# Altium footprint library 2.03-TSSOP&ETSSOP封装.PcbLib: 40 footprints (part 3 of 3)
Each footprint in its own frame and in the unit in brackets; x right, y up, seen from the top. Pads: shape width x height; smd on the part's side, far side on the other; paste and mask are expansions set on the pad; w line width, h text height; cw(c..) or ccw(c..) is an arc to the next point about the centre after c.
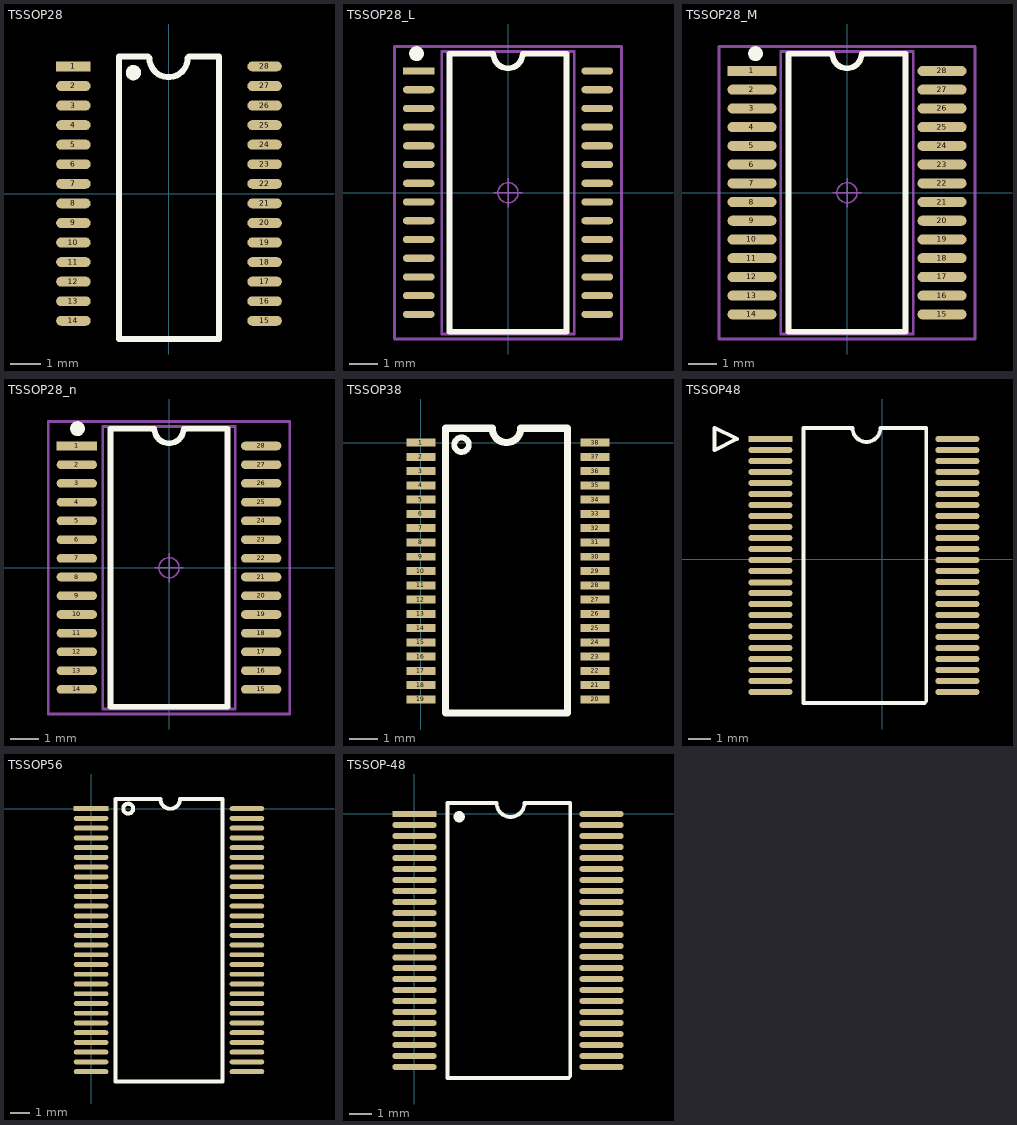
[diagram p2: the footprints below, top view; thin cyan lines are the x and y axes]

## TSSOP28 [mm] "9.70x4.40x1.00 e=0.65  封装库来自淘宝卖家 ID：黄晶宝石"
pads (28):
  rect 1.143x0.33 smd: 1(-3.175,4.225)
  oval 1.143x0.33 smd: 2(-3.175,3.575) 3(-3.175,2.925) 4(-3.175,2.275) 5(-3.175,1.625) 6(-3.175,0.975) 7(-3.175,0.325) 8(-3.175,-0.325) 9(-3.175,-0.975) 10(-3.175,-1.625) 11(-3.175,-2.275) 12(-3.175,-2.925) 13(-3.175,-3.575) 14(-3.175,-4.225) 15(3.175,-4.225) 16(3.175,-3.575) 17(3.175,-2.925) 18(3.175,-2.275) 19(3.175,-1.625) 20(3.175,-0.975) 21(3.175,-0.325) 22(3.175,0.325) 23(3.175,0.975) 24(3.175,1.625) 25(3.175,2.275) 26(3.175,2.925) 27(3.175,3.575) 28(3.175,4.225)
Top Overlay:
  circle w0.254: c-1.182,4.017 r0.127
  lines w0.2: -0.7,4.55 -1.665,4.55 -1.665,-4.829 1.665,-4.829 1.665,4.55 0.672,4.55 ; -0.649,4.499 ccw(c-0.014,4.499) 0.621,4.499
3D body "TSSOP28.STEP": height 1.03, standoff -0.02, extent -3.202,-4.9 3.202,4.9

## TSSOP28_L [mm] "9.8*6.4*1mm（长宽高）"
pads (28):
  rect 1.1x0.25 smd: 1(-3.1,4.225)
  oval 1.1x0.25 smd: 2(-3.1,3.575) 3(-3.1,2.925) 4(-3.1,2.275) 5(-3.1,1.625) 6(-3.1,0.975) 7(-3.1,0.325) 8(-3.1,-0.325) 9(-3.1,-0.975) 10(-3.1,-1.625) 11(-3.1,-2.275) 12(-3.1,-2.925) 13(-3.1,-3.575) 14(-3.1,-4.225) 15(3.1,-4.225) 16(3.1,-3.575) 17(3.1,-2.925) 18(3.1,-2.275) 19(3.1,-1.625) 20(3.1,-0.975) 21(3.1,-0.325) 22(3.1,0.325) 23(3.1,0.975) 24(3.1,1.625) 25(3.1,2.275) 26(3.1,2.925) 27(3.1,3.575) 28(3.1,4.225)
Top Overlay:
  circle w0.254: c-3.175,4.826 r0.13
  lines w0.2: -2.032,-4.826 2.032,-4.826 2.032,4.826 0.508,4.826 cw(c0,4.826) -0.508,4.826 -2.032,4.826 -2.032,-4.826
Mechanical 13:
  lines w0.1: -2.3,-4.9 -2.3,4.9 2.3,4.9 2.3,-4.9 -2.3,-4.9
Mechanical 15:
  circle w0.05: c0,0 r0.35
  lines w0.05: -0.5,0 0.5,0 ; 0,-0.5 0,0.5
  lines w0.1: -3.937,-5.08 -3.937,5.08 3.937,5.08 3.937,-5.08 -3.937,-5.08
3D body "TSSOP28.STEP": height 1.03, standoff -0.02, extent -3.202,-4.9 3.202,4.9

## TSSOP28_M [mm] "9.8*6.4*1mm（长宽高）"
pads (28):
  rect 1.7x0.35 smd: 1(-3.3,4.225)
  oval 1.7x0.35 smd: 2(-3.3,3.575) 3(-3.3,2.925) 4(-3.3,2.275) 5(-3.3,1.625) 6(-3.3,0.975) 7(-3.3,0.325) 8(-3.3,-0.325) 9(-3.3,-0.975) 10(-3.3,-1.625) 11(-3.3,-2.275) 12(-3.3,-2.925) 13(-3.3,-3.575) 14(-3.3,-4.225) 15(3.3,-4.225) 16(3.3,-3.575) 17(3.3,-2.925) 18(3.3,-2.275) 19(3.3,-1.625) 20(3.3,-0.975) 21(3.3,-0.325) 22(3.3,0.325) 23(3.3,0.975) 24(3.3,1.625) 25(3.3,2.275) 26(3.3,2.925) 27(3.3,3.575) 28(3.3,4.225)
Top Overlay:
  circle w0.254: c-3.175,4.826 r0.13
  lines w0.2: -2.032,-4.826 2.032,-4.826 2.032,4.826 0.508,4.826 cw(c0,4.826) -0.508,4.826 -2.032,4.826 -2.032,-4.826
Mechanical 13:
  lines w0.1: -2.3,-4.9 -2.3,4.9 2.3,4.9 2.3,-4.9 -2.3,-4.9
Mechanical 15:
  circle w0.05: c0,0 r0.35
  lines w0.05: -0.5,0 0.5,0 ; 0,-0.5 0,0.5
  lines w0.1: -4.445,-5.08 4.445,-5.08 4.445,5.08 -4.445,5.08 -4.445,-5.08
3D body "TSSOP28.STEP": height 1.03, standoff -0.02, extent -3.202,-4.9 3.202,4.9

## TSSOP28_n [mm] "9.8*6.4*1mm（长宽高） 封装库来自淘宝卖家 ID：黄晶宝石"
pads (28):
  rect 1.4x0.3 smd: 1(-3.2,4.225)
  oval 1.4x0.3 smd: 2(-3.2,3.575) 3(-3.2,2.925) 4(-3.2,2.275) 5(-3.2,1.625) 6(-3.2,0.975) 7(-3.2,0.325) 8(-3.2,-0.325) 9(-3.2,-0.975) 10(-3.2,-1.625) 11(-3.2,-2.275) 12(-3.2,-2.925) 13(-3.2,-3.575) 14(-3.2,-4.225) 15(3.2,-4.225) 16(3.2,-3.575) 17(3.2,-2.925) 18(3.2,-2.275) 19(3.2,-1.625) 20(3.2,-0.975) 21(3.2,-0.325) 22(3.2,0.325) 23(3.2,0.975) 24(3.2,1.625) 25(3.2,2.275) 26(3.2,2.925) 27(3.2,3.575) 28(3.2,4.225)
Top Overlay:
  circle w0.254: c-3.175,4.826 r0.13
  lines w0.2: -2.032,-4.826 2.032,-4.826 2.032,4.826 0.508,4.826 cw(c0,4.826) -0.508,4.826 -2.032,4.826 -2.032,-4.826
Mechanical 13:
  lines w0.1: -2.3,-4.9 -2.3,4.9 2.3,4.9 2.3,-4.9 -2.3,-4.9
Mechanical 15:
  circle w0.05: c0,0 r0.35
  lines w0.05: -0.5,0 0.5,0 ; 0,-0.5 0,0.5
  lines w0.1: -4.191,-5.08 -4.191,5.08 4.191,5.08 4.191,-5.08 -4.191,-5.08
3D body "TSSOP28.STEP": height 1.03, standoff -0.02, extent -3.202,-4.9 3.202,4.9

## TSSOP38 [mil]
pads (38):
  rect 40x11 smd: 1(0,0) 2(0,-19.68) 3(0,-39.37) 4(0,-59.05) 5(0,-78.74) 6(0,-98.42) 7(0,-118.11) 8(0,-137.79) 9(0,-157.48) 10(0,-177.16) 11(0,-196.85) 12(0,-216.53) 13(0,-236.22) 14(0,-255.91) 15(0,-275.59) 16(0,-295.28) 17(0,-314.96) 18(0,-334.65) 19(0,-354.33) 20(240.16,-354.33) 21(240.16,-334.65) 22(240.16,-314.96) 23(240.16,-295.28) 24(240.16,-275.59) 25(240.16,-255.91) 26(240.16,-236.22) 27(240.16,-216.53) 28(240.16,-196.85) 29(240.16,-177.16) 30(240.16,-157.48) 31(240.16,-137.79) 32(240.16,-118.11) 33(240.16,-98.42) 34(240.16,-78.74) 35(240.16,-59.05) 36(240.16,-39.37) 37(240.16,-19.68) 38(240.16,0)
Top Overlay:
  circle w8: c56,-3 r10
  lines w10: 34,-373.03 202,-373.03 202,19.68 137.69,19.68 cw(c118,19.68) 98.31,19.69 34,19.68 34,-373.03

## TSSOP48 [mm]
pads (48):
  rect 2x0.279 smd: 1(-5.08,5.461)
  oval 2x0.279 smd: 2(-5.08,4.961) 3(-5.08,4.461) 4(-5.08,3.961) 5(-5.08,3.461) 6(-5.08,2.961) 7(-5.08,2.461) 8(-5.08,1.961) 9(-5.08,1.461) 10(-5.08,0.961) 11(-5.08,0.461) 12(-5.08,-0.039) 13(-5.08,-0.539) 14(-5.08,-1.059) 15(-5.08,-1.539) 16(-5.08,-2.039) 17(-5.08,-2.539) 18(-5.08,-3.039) 19(-5.08,-3.539) 20(-5.08,-4.039) 21(-5.08,-4.539) 22(-5.08,-5.039) 23(-5.08,-5.539) 24(-5.08,-6.039) 25(3.42,-6.039) 26(3.42,-5.539) 27(3.42,-5.039) 28(3.42,-4.539) 29(3.42,-4.039) 30(3.42,-3.539) 31(3.42,-3.039) 32(3.42,-2.539) 33(3.42,-2.039) 34(3.42,-1.539) 35(3.42,-1.039) 36(3.42,-0.539) 37(3.42,-0.039) 38(3.42,0.461) 39(3.42,0.961) 40(3.42,1.461) 41(3.42,1.961) 42(3.42,2.461) 43(3.42,2.961) 44(3.42,3.461) 45(3.42,3.961) 46(3.42,4.461) 47(3.42,4.961) 48(3.42,5.461)
Top Overlay:
  lines w0.178: 1.92,-6.539 2.001,-6.458 ; 1.92,-6.539 -3.58,-6.539 -3.58,5.961 -1.35,5.961 ccw(c-0.715,5.961) -0.08,5.961 2.001,5.961 2.001,-6.458 ; 1.92,-6.539 2.001,-6.458 ; -7.62,4.953 -6.604,5.461 -7.62,5.969 -7.62,4.953
3D body "TSSOP48.STEP": height 1.1, standoff 0.02, extent -5.059,-6.615 3.141,5.885

## TSSOP56 [mil]
pads (56):
  rect 70x10 smd: 1(0,0)
  oval 70x10 smd: 2(0,-19.68) 3(0,-39.37) 4(0,-59.05) 5(0,-78.74) 6(0,-98.42) 7(0,-118.11) 8(0,-137.79) 9(0,-157.48) 10(0,-177.16) 11(0,-196.85) 12(0,-216.53) 13(0,-236.22) 14(0,-255.91) 15(0,-275.59) 16(0,-295.28) 17(0,-314.96) 18(0,-334.65) 19(0,-354.33) 20(0,-374.02) 21(0,-393.7) 22(0,-413.39) 23(0,-433.07) 24(0,-452.76) 25(0,-472.44) 26(0,-492.13) 27(0,-511.81) 28(0,-531.5) 29(314.96,-531.5) 30(314.96,-511.81) 31(314.96,-492.13) 32(314.96,-472.44) 33(314.96,-452.76) 34(314.96,-433.07) 35(314.96,-413.39) 36(314.96,-393.7) 37(314.96,-374.02) 38(314.96,-354.33) 39(314.96,-334.65) 40(314.96,-314.96) 41(314.96,-295.28) 42(314.96,-275.59) 43(314.96,-255.91) 44(314.96,-236.22) 45(314.96,-216.53) 46(314.96,-196.85) 47(314.96,-177.16) 48(314.96,-157.48) 49(314.96,-137.79) 50(314.96,-118.11) 51(314.96,-98.42) 52(314.96,-78.74) 53(314.96,-59.05) 54(314.96,-39.37) 55(314.96,-19.68) 56(314.96,0)
Top Overlay:
  circle w8: c75,0 r10
  lines w8: 49.21,-551.18 49.21,19.68 140,19.68 ccw(c160,19.68) 180,19.68 265.75,19.68 265.75,-551.18 49.21,-551.18

## TSSOP-48 [mm] "12.50×6.10×0.95 e=0.50 封装库来自淘宝卖家 ID：黄晶宝石"
pads (48):
  rect 2x0.279 smd: 1(0,0)
  oval 2x0.279 smd: 2(0,-0.5) 3(0,-1) 4(0,-1.5) 5(0,-2) 6(0,-2.5) 7(0,-3) 8(0,-3.5) 9(0,-4) 10(0,-4.5) 11(0,-5) 12(0,-5.5) 13(0,-6) 14(0,-6.52) 15(0,-7) 16(0,-7.5) 17(0,-8) 18(0,-8.5) 19(0,-9) 20(0,-9.5) 21(0,-10) 22(0,-10.5) 23(0,-11) 24(0,-11.5) 25(8.5,-11.5) 26(8.5,-11) 27(8.5,-10.5) 28(8.5,-10) 29(8.5,-9.5) 30(8.5,-9) 31(8.5,-8.5) 32(8.5,-8) 33(8.5,-7.5) 34(8.5,-7) 35(8.5,-6.5) 36(8.5,-6) 37(8.5,-5.5) 38(8.5,-5) 39(8.5,-4.5) 40(8.5,-4) 41(8.5,-3.5) 42(8.5,-3) 43(8.5,-2.5) 44(8.5,-2) 45(8.5,-1.5) 46(8.5,-1) 47(8.5,-0.5) 48(8.5,0)
Top Overlay:
  circle w0.254: c2.032,-0.127 r0.127
  lines w0.178: 7,-12 7.081,-11.919 ; 7,-12 1.5,-12 1.5,0.5 3.73,0.5 ccw(c4.365,0.5) 5,0.5 7.081,0.5 7.081,-11.919 ; 7,-12 7.081,-11.919
3D body "TSSOP48.STEP": height 1.1, standoff 0.02, extent 0.091,-11.965 8.291,0.535